# Altium footprint library LTEWlib.PcbLib: 125 footprints (part 6 of 8)
Each footprint in its own frame and in the unit in brackets; x right, y up, seen from the top. Pads: shape width x height; smd on the part's side, far side on the other; paste and mask are expansions set on the pad; w line width, h text height; cw(c..) or ccw(c..) is an arc to the next point about the centre after c.
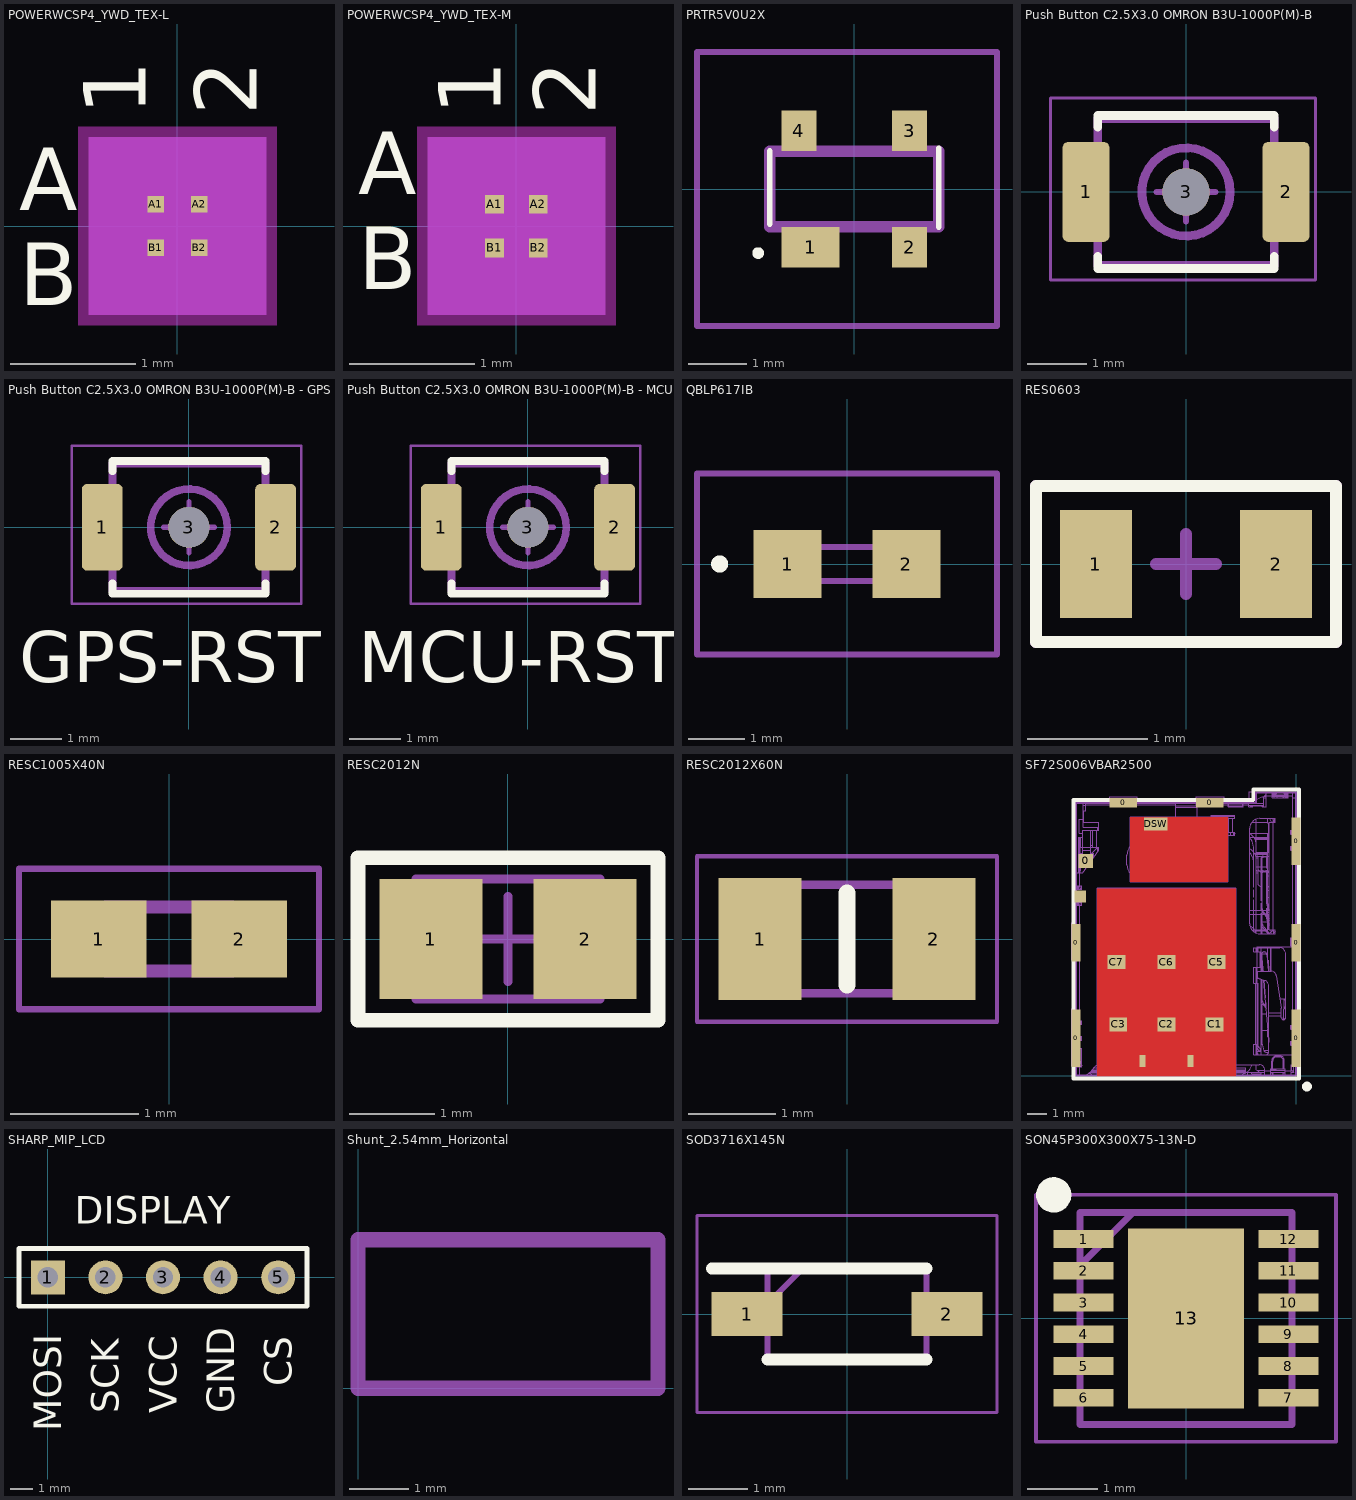
[diagram p5: the footprints below, top view; thin cyan lines are the x and y axes]

## POWERWCSP4_YWD_TEX-L [mm]
pads (4):
  rect 0.133x0.133 smd paste+0 mask+0: A1(-0.175,0.175) A2(0.175,0.175) B1(-0.175,-0.175) B2(0.175,-0.175)
Top Overlay:
  text "A" at -1.27,0.127 h0.5
  text "B" at -1.27,-0.635 h0.5
  text "1" at -0.254,0.889 h0.5
  text "2" at 0.635,0.889 h0.5
Bottom Overlay:
  text "A" at -0.889,0.127 h0.5
  text "B" at -0.889,-0.635 h0.5
  text "1" at -0.762,0.889 h0.5
  text "2" at 0.127,0.889 h0.5
Keep-Out Layer:
  region: -0.794,-0.795 -0.794,0.795 0.794,0.795 0.794,-0.795
Mechanical 5:
  region: 0.711,-0.711 -0.711,-0.711 -0.711,0.711 0.711,0.711
Mechanical 13:
  lines w0.025: -0.33,0.155 -0.155,0.33 ; -0.33,-0.33 0.33,-0.33 0.33,0.33 -0.33,0.33 -0.33,-0.33
  text "A" at -1.27,0.127 h0.5
  text "B" at -1.27,-0.635 h0.5
  text "1" at -0.254,0.889 h0.5
  text "2" at 0.635,0.889 h0.5
Mechanical 15:
  region: 0.584,-0.584 -0.584,-0.584 -0.584,0.584 0.584,0.584
  lines w0.152: -0.584,-0.584 -0.584,0.584 0.584,0.584 0.584,-0.584 -0.584,-0.584
3D body "POWERWCSP4_YWD_TEX.step": height 0.31, standoff 0, extent -0.33,-0.33 0.33,0.33

## POWERWCSP4_YWD_TEX-M [mm]
pads (4):
  rect 0.151x0.151 smd paste+0 mask+0: A1(-0.175,0.175) A2(0.175,0.175) B1(-0.175,-0.175) B2(0.175,-0.175)
Top Overlay:
  text "A" at -1.27,0.254 h0.5
  text "B" at -1.27,-0.508 h0.5
  text "1" at -0.127,0.889 h0.5
  text "2" at 0.635,0.889 h0.5
Bottom Overlay:
  text "A" at -0.889,0.254 h0.5
  text "B" at -0.889,-0.508 h0.5
  text "1" at -0.635,0.889 h0.5
  text "2" at 0.127,0.889 h0.5
Keep-Out Layer:
  region: -0.794,-0.795 -0.794,0.795 0.794,0.795 0.794,-0.795
Mechanical 5:
  region: 0.711,-0.711 -0.711,-0.711 -0.711,0.711 0.711,0.711
Mechanical 13:
  lines w0.025: -0.33,0.155 -0.155,0.33 ; -0.33,-0.33 0.33,-0.33 0.33,0.33 -0.33,0.33 -0.33,-0.33
  text "A" at -1.27,0.254 h0.5
  text "B" at -1.27,-0.508 h0.5
  text "1" at -0.127,0.889 h0.5
  text "2" at 0.635,0.889 h0.5
Mechanical 15:
  region: 0.584,-0.584 -0.584,-0.584 -0.584,0.584 0.584,0.584
  lines w0.152: -0.584,-0.584 -0.584,0.584 0.584,0.584 0.584,-0.584 -0.584,-0.584
3D body "POWERWCSP4_YWD_TEX.step": height 0.31, standoff 0, extent -0.33,-0.33 0.33,0.33

## PRTR5V0U2X [mm]
pads (4):
  rect 1x0.7 smd: 1(-0.75,-1)
  rect 0.6x0.7 smd: 2(0.95,-1) 3(0.95,1) 4(-0.95,1)
Top Overlay:
  lines w0.1: -1.45,-0.6 -1.45,0.65 ; 1.45,-0.65 1.45,0.7 ; -1.7,-1.1 ccw(c-1.65,-1.1) -1.6,-1.1 ccw(c-1.65,-1.1) -1.7,-1.1
Mechanical 13:
  lines w0.2: -1.45,-0.65 1.45,-0.65 1.45,0.65 -1.45,0.65 -1.45,-0.65
Mechanical 15:
  lines w0.1: -2.7,-2.35 2.45,-2.35 2.45,2.35 -2.7,2.35 -2.7,-2.35
3D body "PRTR5V0U2X,215.stp": height 0.95, standoff 0, extent -1.46,-1.197 1.44,1.203

## Push Button C2.5X3.0 OMRON B3U-1000P(M)-B [mm] "Push Button C2.5X3.0 OMRON B3U-1000P(M)-B"
height 1.6
pads (3):
  rrect25% 0.8x1.7 smd: 1(-1.7,0) 2(1.7,0)
  round 0.8 hole 0.8 unplated: 3(0,0)
Top Overlay:
  lines w0.15: -1.5,-1.1 -1.5,-1.3 1.5,-1.3 1.5,-1.1 ; -1.5,1.1 -1.5,1.3 1.5,1.3 1.5,1.1
Top Courtyard:
  lines w0.05: -2.3,-1.5 -2.3,1.6 2.2,1.6 2.2,-1.5 -2.3,-1.5
  lines w0.1: -0.5,0 0.5,0 ; 0,-0.5 0,0.5
Top Component Outline:
  circle w0.15: c0,0 r0.75
  lines w0.15: -1.5,-1.25 -1.5,1.25 1.5,1.25 1.5,-1.25 -1.5,-1.25
3D body: height 1.2, standoff 0, extent -1.5,-1.25 1.5,1.25
3D body: height 1.6, standoff 1.2, extent -0.749,-0.749 0.749,0.749

## Push Button C2.5X3.0 OMRON B3U-1000P(M)-B - GPS RST [mm] "Push Button C2.5X3.0 OMRON B3U-1000P(M)-B"
height 1.6
pads (3):
  rrect25% 0.8x1.7 smd: 1(-1.7,0) 2(1.7,0)
  round 0.8 hole 0.8 unplated: 3(0,0)
Top Overlay:
  lines w0.15: -1.5,-1.1 -1.5,-1.3 1.5,-1.3 1.5,-1.1 ; -1.5,1.1 -1.5,1.3 1.5,1.3 1.5,1.1
  text "GPS-RST" at -3.332,-3.04 h1
Top Courtyard:
  lines w0.05: -2.3,-1.5 -2.3,1.6 2.2,1.6 2.2,-1.5 -2.3,-1.5
  lines w0.1: -0.5,0 0.5,0 ; 0,-0.5 0,0.5
Top Component Outline:
  circle w0.15: c0,0 r0.75
  lines w0.15: -1.5,-1.25 -1.5,1.25 1.5,1.25 1.5,-1.25 -1.5,-1.25
3D body: height 1.2, standoff 0, extent -1.5,-1.25 1.5,1.25
3D body: height 1.6, standoff 1.2, extent -0.749,-0.749 0.749,0.749

## Push Button C2.5X3.0 OMRON B3U-1000P(M)-B - MCU RST [mm] "Push Button C2.5X3.0 OMRON B3U-1000P(M)-B"
height 1.6
pads (3):
  rrect25% 0.8x1.7 smd: 1(-1.7,0) 2(1.7,0)
  round 0.8 hole 0.8 unplated: 3(0,0)
Top Overlay:
  lines w0.15: -1.5,-1.1 -1.5,-1.3 1.5,-1.3 1.5,-1.1 ; -1.5,1.1 -1.5,1.3 1.5,1.3 1.5,1.1
  text "MCU-RST" at -3.332,-3.04 h1
Top Courtyard:
  lines w0.05: -2.3,-1.5 2.2,-1.5 2.2,1.6 -2.3,1.6 -2.3,-1.5
  lines w0.1: -0.5,0 0.5,0 ; 0,-0.5 0,0.5
Top Component Outline:
  circle w0.15: c0,0 r0.75
  lines w0.15: -1.5,-1.25 1.5,-1.25 1.5,1.25 -1.5,1.25 -1.5,-1.25
3D body: height 1.6, standoff 1.2, extent -0.749,-0.749 0.749,0.749
3D body: height 1.2, standoff 0, extent -1.5,-1.25 1.5,1.25

## QBLP617IB [mm]
pads (2):
  rect 1.2x1.2 smd: 1(-1.05,0) 2(1.05,0)
Top Overlay:
  lines w0.2: -2.3,0 ccw(c-2.25,0) -2.2,0 ; -2.3,0 cw(c-2.25,0) -2.2,0 ; -2.3,0 ccw(c-2.25,0) -2.2,0
Mechanical 13:
  lines w0.1: -0.8,-0.3 0.8,-0.3 0.8,0.3 -0.8,0.3 -0.8,-0.3
Mechanical 15:
  lines w0.1: -2.65,-1.6 2.65,-1.6 2.65,1.6 -2.65,1.6 -2.65,-1.6

## RES0603 [mm] "SMD 0603"
pads (2):
  rect 0.6x0.9 smd: 1(-0.75,0) 2(0.75,0)
Top Overlay:
  lines w0.1: -1.25,-0.65 1.25,-0.65 1.25,0.65 -1.25,0.65 -1.25,-0.65
Top Courtyard:
  lines w0.1: -0.25,0 0,0 ; 0,-0.25 0,0 ; 0,0.25 0,0 ; 0.25,0 0,0 ; -1.25,-0.65 1.25,-0.65 1.25,0.65 -1.25,0.65 -1.25,-0.65
3D body "User Library-0603 SMD Resistor.step": height 0.3, standoff 0, extent -0.8,-0.4 0.8,0.4

## RESC1005X40N [mm]
pads (2):
  rect 0.75x0.6 smd: 1(-0.55,0) 2(0.55,0)
Mechanical 13:
  lines w0.1: -0.5,-0.25 -0.5,0.25 0.5,0.25 0.5,-0.25 -0.5,-0.25
Mechanical 15:
  lines w0.05: -1.175,-0.55 -1.175,0.55 1.175,0.55 1.175,-0.55 -1.175,-0.55
3D body "RC0402JR-0710KL.stp": height 0.4, standoff 0, extent -0.5,-0.25 0.5,0.25

## RESC2012N [mm] "Chip Resistor, Body 2.0x1.3mm, IPC Medium Density"
height 0.65
pads (2):
  rect 1.2x1.4 smd: 1(-0.9,0) 2(0.9,0)
Top Overlay:
  lines w0.17: -1.75,-0.95 -1.75,0.95 1.75,0.95 1.75,-0.95 -1.75,-0.95
Top Courtyard:
  lines w0.1: -0.5,0 0.5,0 ; 0,-0.5 0,0.5 ; -1.75,-0.95 1.75,-0.95 1.75,0.95 -1.75,0.95 -1.75,-0.95
Top 3D Body:
  lines w0.1: -1.075,-0.7 -1.075,0.7 1.075,0.7 1.075,-0.7 -1.075,-0.7
3D body "User Library-0805 SMD Resistor (1).step": height 0.78, standoff 0, extent -1,-0.625 1,0.625

## RESC2012X60N [mm]
pads (2):
  rect 0.95x1.4 smd: 1(-1,0) 2(1,0)
Top Overlay:
  lines w0.2: 0,-0.525 0,0.525
Mechanical 13:
  lines w0.1: -1,-0.625 1,-0.625 1,0.625 -1,0.625 -1,-0.625
Mechanical 15:
  lines w0.05: -1.725,-0.95 1.725,-0.95 1.725,0.95 -1.725,0.95 -1.725,-0.95
3D body "RK73B2ATTD100J.stp": height 0.6, standoff 0, extent -1,-0.625 1,0.625

## SF72S006VBAR2500 [mm]
pads (18):
  rect 0.45x2.9 smd: 0(-11.175,1.9) 0(0,1.9)
  rect 0.45x1.9 smd: 0(-11.175,6.75) 0(0,6.75)
  rect 0.75x0.7 smd: 0(-10.675,10.9)
  rect 1.4x0.5 smd: 0(-8.78,13.85) 0(-4.38,13.85)
  rect 0.3x0.6 smd: 0(-7.8,0.75) 0(-5.36,0.75)
  rect 0.45x2.4 smd: 0(0,11.9)
  rect 0.9x0.7 smd: C1(-4.14,2.6) C2(-6.58,2.6) C3(-9.02,2.6) C5(-4.04,5.77) C6(-6.58,5.77) C7(-9.12,5.77)
  rect 0.6x0.6 smd: CSW(-10.95,9.1)
  rect 1.2x0.65 smd: DSW(-7.13,12.775)
Top Layer:
  pour cut-out: -10.084,9.5 -3.073,9.5 -3.073,-0.025 -10.084,-0.025
  pour cut-out: -8.407,13.106 -3.48,13.106 -3.48,9.855 -8.407,9.855
Top Overlay:
  lines w0.2: -11.3,-0.15 -11.3,14 -2.175,14 -2.175,14.525 0.15,14.525 0.15,-0.15 -11.3,-0.15
  lines w0.25: 0.443,-0.486 ccw(c0.55,-0.55) 0.462,-0.462
Mechanical 7:
  drawing of 1191 lines, arcs and shapes, not listed
  text ".Designator" at -6.214,5.15 h0.38
Mechanical 15:
  lines w0.1: -11.175,0 0,0 0,14.375 -2.025,14.375 -2.025,13.85 -11.175,13.85 -11.175,0 ; -10.08,0 -10.08,9.5 -3.08,9.5 -3.08,0 -10.08,0 ; -8.4,9.85 -3.48,9.85 -3.48,13.1 -8.4,13.1 -8.4,9.85
  text "NO VIA / NO TRACE" at -8.382,10.668 h0.55
  text "NO VIA / NO TRACE" at -9.144,7.366 h0.55
3D body "K3D-SF72S006VBA-V2_JAE_Proprietary.STEP": height 1.25, standoff 0, extent -11.2,0.05 0.02,14.4

## SHARP_MIP_LCD [mm] "Connector; Header; 3 Position"
pads (5):
  rect 1.5x1.5 hole 0.9: 1(0,0)
  round 1.5 hole 0.9: 2(2.54,0) 3(5.08,0) 4(7.62,0) 5(10.16,0)
Top Overlay:
  lines w0.2: -1.27,-1.27 11.43,-1.27 11.43,1.27 -1.27,1.27 -1.27,-1.27
  text "CS" at 10.76,-4.793 h1.2
  text "GND" at 8.22,-5.993 h1.2
  text "VCC" at 5.68,-5.993 h1.2
  text "SCK" at 3.14,-5.993 h1.2
  text "MOSI" at 0.6,-6.793 h1.2
  text "DISPLAY" at 1.181,2.356 h1.2

## Shunt_2.54mm_Horizontal [mm]
Top 3D Body:
  lines w0.254: 0,0 5.029,0 5.029,2.489 0,2.489 0,0
3D body "User Library-Control System_FCI_68786-102LF.STEP": height 3.04, standoff 0.56, extent 0,-2.54 5.029,2.54

## SOD3716X145N [mm]
pads (2):
  rect 1.2x0.75 smd: 1(-1.7,0) 2(1.7,0)
Top Overlay:
  lines w0.2: -2.3,0.775 1.35,0.775 ; -1.35,-0.775 1.35,-0.775
Mechanical 13:
  lines w0.1: -1.35,0.175 -0.75,0.775 ; -1.35,-0.775 1.35,-0.775 1.35,0.775 -1.35,0.775 -1.35,-0.775
Mechanical 15:
  lines w0.05: -2.55,-1.675 2.55,-1.675 2.55,1.675 -2.55,1.675 -2.55,-1.675
3D body "BZT52C9V1S-7-F.stp": height 1.45, standoff 0, extent -1.85,-0.775 1.85,0.775

## SON45P300X300X75-13N-D [mm]
pads (13):
  rect 0.85x0.25 smd: 1(-1.45,1.125) 2(-1.45,0.675) 3(-1.45,0.225) 4(-1.45,-0.225) 5(-1.45,-0.675) 6(-1.45,-1.125) 7(1.45,-1.125) 8(1.45,-0.675) 9(1.45,-0.225) 10(1.45,0.225) 11(1.45,0.675) 12(1.45,1.125)
  rect 1.65x2.55 smd: 13(0,0)
Top Overlay:
  circle w0.25: c-1.875,1.75 r0.125
Mechanical 13:
  lines w0.1: -1.5,0.75 -0.75,1.5 ; -1.5,-1.5 1.5,-1.5 1.5,1.5 -1.5,1.5 -1.5,-1.5
Mechanical 15:
  lines w0.05: -2.125,-1.75 2.125,-1.75 2.125,1.75 -2.125,1.75 -2.125,-1.75
3D body "FT234XD-R.stp": height 0.75, standoff 0, extent -1.55,-1.5 1.55,1.5